# Altium footprint library Terra.PcbLib: 59 footprints (part 2 of 4)
Each footprint in its own frame and in the unit in brackets; x right, y up, seen from the top. Pads: shape width x height; smd on the part's side, far side on the other; paste and mask are expansions set on the pad; w line width, h text height; cw(c..) or ccw(c..) is an arc to the next point about the centre after c.
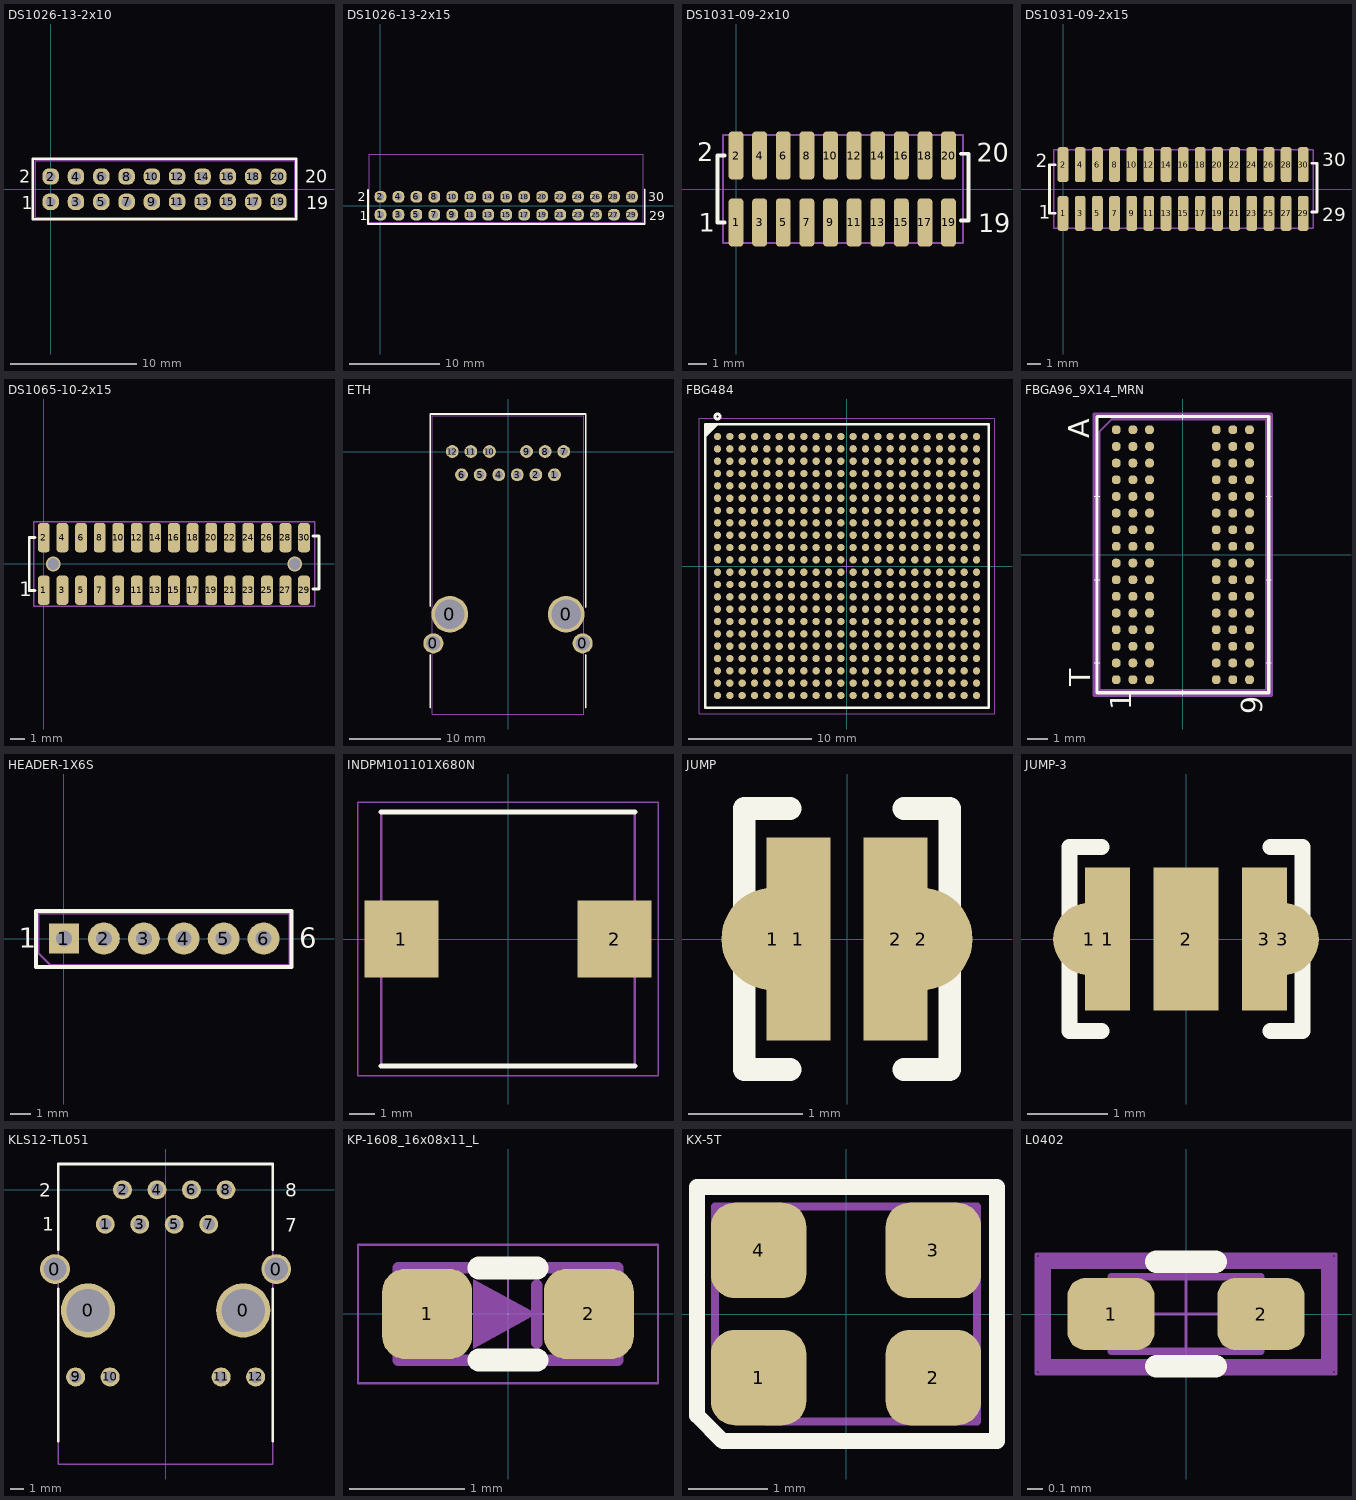
[diagram p1: the footprints below, top view; thin cyan lines are the x and y axes]

## DS1026-13-2x10 [mm]
pads (20):
  rrect80% 1.3x1.3 hole 0.8 mask+0.1: 1(0,-1) 2(0,1) 3(2,-1) 4(2,1) 5(4,-1) 6(4,1) 7(6,-1) 8(6,1) 9(8,-1) 10(8,1) 11(10,-1) 12(10,1) 13(12,-1) 14(12,1) 15(14,-1) 16(14,1) 17(16,-1) 18(16,1) 19(18,-1) 20(18,1)
Top Overlay:
  lines w0.2: -1.4,-2.375 19.4,-2.375 19.4,2.4 -1.4,2.4 -1.4,-2.375
  text "19" at 20.2,-1.6 h1
  text "1" at -2.3,-1.6 h1
  text "20" at 20.1,0.5 h1
  text "2" at -2.5,0.5 h1
  text ".Designator" at 5.6,-3.3 h1
Mechanical 1:
  lines w0.1: -1.226,-2.271 -1.225,2.255 19.276,2.25 19.274,-2.276 -1.226,-2.271
  text ".Designator" at 0.95,-0.4 h1.5
  text "1" at -0.1,-1.4 h1
  text "2" at -0.3,0.7 h1
  text "19" at 17.5,-1.5 h1
  text "20" at 17.6,0.6 h1
3D body: height 6.5, standoff -1.5, extent -1.27,-2.265 19.27,2.275

## DS1026-13-2x15 [mm]
pads (30):
  rrect80% 1.3x1.3 hole 0.8 mask+0.1: 1(0,-1) 2(0,1) 3(2,-1) 4(2,1) 5(4,-1) 6(4,1) 7(6,-1) 8(6,1) 9(8,-1) 10(8,1) 11(10,-1) 12(10,1) 13(12,-1) 14(12,1) 15(14,-1) 16(14,1) 17(16,-1) 18(16,1) 19(18,-1) 20(18,1) 21(20,-1) 22(20,1) 23(22,-1) 24(22,1) 25(24,-1) 26(24,1) 27(26,-1) 28(26,1) 29(28,-1) 30(28,1)
Top Overlay:
  lines w0.2: -1.375,1.75 -1.375,-2.025 29.425,-2.025 29.425,1.8
  text ".Designator" at 9.658,-3.468 h1
  text "2" at -2.5,0.5 h1
  text "30" at 29.8,0.5 h1
  text "1" at -2.3,-1.6 h1
  text "29" at 29.9,-1.6 h1
Mechanical 1:
  lines w0.1: -1.226,-1.846 29.274,-1.854 29.276,5.749 -1.224,5.757 -1.226,-1.846
  text "30" at 27.3,0.6 h1
  text "29" at 27.2,-1.5 h1
  text "2" at -0.3,0.7 h1
  text "1" at -0.1,-1.4 h1
  text ".Designator" at 8.5,1.2 h1.5
3D body "DS1026-13.STEP": height 5, standoff -1.9, extent -1.225,-1.375 29.275,5.725

## DS1031-09-2x10 [mm]
pads (20):
  rrect50% 0.8x2.6 smd mask+0.1: 1(0,-1.8) 2(0,1.8) 3(1.27,-1.8) 4(1.27,1.8) 5(2.54,-1.8) 6(2.54,1.8) 7(3.81,-1.8) 8(3.81,1.8) 9(5.08,-1.8) 10(5.08,1.8) 11(6.35,-1.8) 12(6.35,1.8) 13(7.62,-1.8) 14(7.62,1.8) 15(8.89,-1.8) 16(8.89,1.8) 17(10.16,-1.8) 18(10.16,1.8) 19(11.43,-1.8) 20(11.43,1.8)
Top Overlay:
  lines w0.2: -0.6,-1.8 -1,-1.8 -1,1.8 -0.6,1.8 ; 12.1,-1.7 12.5,-1.7 12.5,1.9 12.1,1.9
  text "1" at -2,-2.3 h1
  text "2" at -2.1,1.5 h1
  text "19" at 13.036,-2.328 h1
  text "20" at 12.936,1.472 h1
  text ".Designator" at 2.558,3.732 h1
Mechanical 1:
  lines w0.1: -0.701,-2.898 12.199,-2.901 12.201,2.897 -0.7,2.9 -0.701,-2.898
  text "1" at -2,-2.3 h1
  text "2" at -2.1,1.5 h1
  text "20" at 12.936,1.472 h1
  text "19" at 13.036,-2.328 h1
  text ".Designator" at 2.1,-0.7 h1.5
3D body "DS1031-09-2X10.STEP": height 5.96, standoff -0.04, extent -0.61,-2.85 12.09,2.85

## DS1031-09-2x15 [mm]
pads (30):
  rrect50% 0.8x2.6 smd mask+0.1: 1(0,-1.8) 2(0,1.8) 3(1.27,-1.8) 4(1.27,1.8) 5(2.54,-1.8) 6(2.54,1.8) 7(3.81,-1.8) 8(3.81,1.8) 9(5.08,-1.8) 10(5.08,1.8) 11(6.35,-1.8) 12(6.35,1.8) 13(7.62,-1.8) 14(7.62,1.8) 15(8.89,-1.8) 16(8.89,1.8) 17(10.16,-1.8) 18(10.16,1.8) 19(11.43,-1.8) 20(11.43,1.8) 21(12.7,-1.8) 22(12.7,1.8) 23(13.97,-1.8) 24(13.97,1.8) 25(15.24,-1.8) 26(15.24,1.8) 27(16.51,-1.8) 28(16.51,1.8) 29(17.78,-1.8) 30(17.78,1.8)
Top Overlay:
  lines w0.2: -0.6,-1.8 -1,-1.8 -1,1.8 -0.6,1.8 ; 18.4,-1.7 18.8,-1.7 18.8,1.9 18.4,1.9
  text ".Designator" at 3.958,3.532 h1
  text "1" at -1.8,-2.2 h1
  text "30" at 19.2,1.7 h1
  text "29" at 19.2,-2.4 h1
  text "2" at -2,1.6 h1
Mechanical 1:
  lines w0.1: -0.701,-2.898 18.499,-2.903 18.501,2.895 -0.7,2.9 -0.701,-2.898
  text ".Designator" at 3.8,-0.5 h1.5
  text "2" at -0.1,1.4 h1
  text "1" at 0,-1.8 h1
  text "30" at 16.3,1.4 h1
  text "29" at 16.1,-2.5 h1
3D body "DS1031-09-2X15X.STEP": height 5.97, standoff -0.03, extent -0.66,-2.881 18.39,2.819

## DS1065-10-2х15 [mm]
pads (30):
  rrect50% 0.8x2 smd mask+0.1: 1(0,-1.8) 2(0,1.8) 3(1.27,-1.8) 4(1.27,1.8) 5(2.54,-1.8) 6(2.54,1.8) 7(3.81,-1.8) 8(3.81,1.8) 9(5.08,-1.8) 10(5.08,1.8) 11(6.35,-1.8) 12(6.35,1.8) 13(7.62,-1.8) 14(7.62,1.8) 15(8.89,-1.8) 16(8.89,1.8) 17(10.16,-1.8) 18(10.16,1.8) 19(11.43,-1.8) 20(11.43,1.8) 21(12.7,-1.8) 22(12.7,1.8) 23(13.97,-1.8) 24(13.97,1.8) 25(15.24,-1.8) 26(15.24,1.8) 27(16.51,-1.8) 28(16.51,1.8) 29(17.78,-1.8) 30(17.78,1.8)
via 17.145,0 diameter 1 hole 0.8
via 0.635,0 diameter 1 hole 0.8
Top Overlay:
  lines w0.2: -0.6,-1.8 -1,-1.8 -1,1.8 -0.6,1.8 ; 18.4,-1.7 18.8,-1.7 18.8,1.9 18.4,1.9
  text ".Designator" at 4.858,3.532 h1
  text "1" at -1.7,-2.2 h1
Mechanical 1:
  lines w0.1: -0.701,-2.898 -0.7,2.9 18.501,2.895 18.499,-2.903 -0.701,-2.898
  text ".Designator" at 5.08,-0.508 h0.8
3D body "DS1065-05.STEP": height 4.45, standoff -0.9, extent -0.81,-2.35 18.56,2.35

## ETH [mm] "10/100 ETH разъём с двумя светодиодами"
height 14
pads (16):
  round 2.2 hole 1.6 mask+0.1: 0(-8.15,-20.96) 0(8.15,-20.96)
  round 4 hole 3.2 mask+0.1: 0(-6.35,-17.78) 0(6.35,-17.78)
  round 1.4 hole 0.9 mask+0.1: 1(5.075,-2.54) 2(3.045,-2.54) 3(1.015,-2.54) 4(-1.015,-2.54) 5(-3.045,-2.54) 6(-5.075,-2.54) 7(6.09,0) 8(4.06,0) 9(2.03,0) 10(-2.03,0) 11(-4.06,0) 12(-6.09,0)
Top Overlay:
  lines w0.2: -8.5,-28 -8.5,-22.2 ; -8.5,-16.9 -8.5,4.1 8.5,4.1 8.5,-17 ; 8.5,-28 8.5,-22.2
Mechanical 1:
  lines w0.1: -8.3,-28.68 -8.3,3.9 8.3,3.9 8.3,-28.68 -8.3,-28.68
  text "12" at -6.7,1.3 h1
  text "7" at 6.2,1.3 h1
  text "6" at -5.7,-4.7 h1
  text "1" at 4.9,-4.7 h1
  text ".Designator" at -5.4,-10.575 h2

## FBG484 [mm] "BGA, 484-Balls, Body 23x23mm, Pitch 1.0mm"
height 2.54
pads (484):
  round 0.6 smd: A1(-10.5,10.5) A2(-9.5,10.5) A3(-8.5,10.5) A4(-7.5,10.5) A5(-6.5,10.5) A6(-5.5,10.5) A7(-4.5,10.5) A8(-3.5,10.5) A9(-2.5,10.5) A10(-1.5,10.5) A11(-0.5,10.5) A12(0.5,10.5) A13(1.5,10.5) A14(2.5,10.5) A15(3.5,10.5) A16(4.5,10.5) A17(5.5,10.5) A18(6.5,10.5) A19(7.5,10.5) A20(8.5,10.5) A21(9.5,10.5) A22(10.5,10.5) AA1(-10.5,-9.5) AA2(-9.5,-9.5) AA3(-8.5,-9.5) AA4(-7.5,-9.5) AA5(-6.5,-9.5) AA6(-5.5,-9.5) AA7(-4.5,-9.5) AA8(-3.5,-9.5) AA9(-2.5,-9.5) AA10(-1.5,-9.5) AA11(-0.5,-9.5) AA12(0.5,-9.5) AA13(1.5,-9.5) AA14(2.5,-9.5) AA15(3.5,-9.5) AA16(4.5,-9.5) AA17(5.5,-9.5) AA18(6.5,-9.5) AA19(7.5,-9.5) AA20(8.5,-9.5) AA21(9.5,-9.5) AA22(10.5,-9.5) AB1(-10.5,-10.5) AB2(-9.5,-10.5) AB3(-8.5,-10.5) AB4(-7.5,-10.5) AB5(-6.5,-10.5) AB6(-5.5,-10.5) AB7(-4.5,-10.5) AB8(-3.5,-10.5) AB9(-2.5,-10.5) AB10(-1.5,-10.5) AB11(-0.5,-10.5) AB12(0.5,-10.5) AB13(1.5,-10.5) AB14(2.5,-10.5) AB15(3.5,-10.5) AB16(4.5,-10.5) AB17(5.5,-10.5) AB18(6.5,-10.5) AB19(7.5,-10.5) AB20(8.5,-10.5) AB21(9.5,-10.5) AB22(10.5,-10.5) B1(-10.5,9.5) B2(-9.5,9.5) B3(-8.5,9.5) B4(-7.5,9.5) B5(-6.5,9.5) B6(-5.5,9.5) B7(-4.5,9.5) B8(-3.5,9.5) B9(-2.5,9.5) B10(-1.5,9.5) B11(-0.5,9.5) B12(0.5,9.5) B13(1.5,9.5) B14(2.5,9.5) B15(3.5,9.5) B16(4.5,9.5) B17(5.5,9.5) B18(6.5,9.5) B19(7.5,9.5) B20(8.5,9.5) B21(9.5,9.5) B22(10.5,9.5) C1(-10.5,8.5) C2(-9.5,8.5) C3(-8.5,8.5) C4(-7.5,8.5) C5(-6.5,8.5) C6(-5.5,8.5) C7(-4.5,8.5) C8(-3.5,8.5) C9(-2.5,8.5) C10(-1.5,8.5) C11(-0.5,8.5) C12(0.5,8.5) C13(1.5,8.5) C14(2.5,8.5) C15(3.5,8.5) C16(4.5,8.5) C17(5.5,8.5) C18(6.5,8.5) C19(7.5,8.5) C20(8.5,8.5) C21(9.5,8.5) C22(10.5,8.5) D1(-10.5,7.5) D2(-9.5,7.5) D3(-8.5,7.5) D4(-7.5,7.5) D5(-6.5,7.5) D6(-5.5,7.5) D7(-4.5,7.5) D8(-3.5,7.5) D9(-2.5,7.5) D10(-1.5,7.5) D11(-0.5,7.5) D12(0.5,7.5) D13(1.5,7.5) D14(2.5,7.5) D15(3.5,7.5) D16(4.5,7.5) D17(5.5,7.5) D18(6.5,7.5) D19(7.5,7.5) D20(8.5,7.5) D21(9.5,7.5) D22(10.5,7.5) E1(-10.5,6.5) E2(-9.5,6.5) E3(-8.5,6.5) E4(-7.5,6.5) E5(-6.5,6.5) E6(-5.5,6.5) E7(-4.5,6.5) E8(-3.5,6.5) E9(-2.5,6.5) E10(-1.5,6.5) E11(-0.5,6.5) E12(0.5,6.5) E13(1.5,6.5) E14(2.5,6.5) E15(3.5,6.5) E16(4.5,6.5) E17(5.5,6.5) E18(6.5,6.5) E19(7.5,6.5) E20(8.5,6.5) E21(9.5,6.5) E22(10.5,6.5) F1(-10.5,5.5) F2(-9.5,5.5) F3(-8.5,5.5) F4(-7.5,5.5) F5(-6.5,5.5) F6(-5.5,5.5) F7(-4.5,5.5) F8(-3.5,5.5) F9(-2.5,5.5) F10(-1.5,5.5) F11(-0.5,5.5) F12(0.5,5.5) F13(1.5,5.5) F14(2.5,5.5) F15(3.5,5.5) F16(4.5,5.5) F17(5.5,5.5) F18(6.5,5.5) F19(7.5,5.5) F20(8.5,5.5) F21(9.5,5.5) F22(10.5,5.5) G1(-10.5,4.5) G2(-9.5,4.5) G3(-8.5,4.5) G4(-7.5,4.5) G5(-6.5,4.5) G6(-5.5,4.5) G7(-4.5,4.5) G8(-3.5,4.5) G9(-2.5,4.5) G10(-1.5,4.5) G11(-0.5,4.5) G12(0.5,4.5) G13(1.5,4.5) G14(2.5,4.5) G15(3.5,4.5) G16(4.5,4.5) G17(5.5,4.5) G18(6.5,4.5) G19(7.5,4.5) G20(8.5,4.5) G21(9.5,4.5) G22(10.5,4.5) H1(-10.5,3.5) H2(-9.5,3.5) H3(-8.5,3.5) H4(-7.5,3.5) H5(-6.5,3.5) H6(-5.5,3.5) H7(-4.5,3.5) H8(-3.5,3.5) H9(-2.5,3.5) H10(-1.5,3.5) H11(-0.5,3.5) H12(0.5,3.5) H13(1.5,3.5) H14(2.5,3.5) H15(3.5,3.5) H16(4.5,3.5) H17(5.5,3.5) H18(6.5,3.5) H19(7.5,3.5) H20(8.5,3.5) H21(9.5,3.5) H22(10.5,3.5) J1(-10.5,2.5) J2(-9.5,2.5) J3(-8.5,2.5) J4(-7.5,2.5) J5(-6.5,2.5) J6(-5.5,2.5) J7(-4.5,2.5) J8(-3.5,2.5) J9(-2.5,2.5) J10(-1.5,2.5) J11(-0.5,2.5) J12(0.5,2.5) J13(1.5,2.5) J14(2.5,2.5) J15(3.5,2.5) J16(4.5,2.5) J17(5.5,2.5) J18(6.5,2.5) J19(7.5,2.5) J20(8.5,2.5) J21(9.5,2.5) J22(10.5,2.5) K1(-10.5,1.5) K2(-9.5,1.5) K3(-8.5,1.5) K4(-7.5,1.5) K5(-6.5,1.5) K6(-5.5,1.5) K7(-4.5,1.5) K8(-3.5,1.5) K9(-2.5,1.5) K10(-1.5,1.5) K11(-0.5,1.5) K12(0.5,1.5) K13(1.5,1.5) K14(2.5,1.5) K15(3.5,1.5) K16(4.5,1.5) K17(5.5,1.5) K18(6.5,1.5) K19(7.5,1.5) K20(8.5,1.5) K21(9.5,1.5) K22(10.5,1.5) L1(-10.5,0.5) L2(-9.5,0.5) L3(-8.5,0.5) L4(-7.5,0.5) L5(-6.5,0.5) L6(-5.5,0.5) L7(-4.5,0.5) L8(-3.5,0.5) L9(-2.5,0.5) L10(-1.5,0.5) L11(-0.5,0.5) L12(0.5,0.5) L13(1.5,0.5) L14(2.5,0.5) L15(3.5,0.5) L16(4.5,0.5) L17(5.5,0.5) L18(6.5,0.5) L19(7.5,0.5) L20(8.5,0.5) L21(9.5,0.5) L22(10.5,0.5) M1(-10.5,-0.5) M2(-9.5,-0.5) M3(-8.5,-0.5) M4(-7.5,-0.5) M5(-6.5,-0.5) M6(-5.5,-0.5) M7(-4.5,-0.5) M8(-3.5,-0.5) M9(-2.5,-0.5) M10(-1.5,-0.5) M11(-0.5,-0.5) M12(0.5,-0.5) M13(1.5,-0.5) M14(2.5,-0.5) M15(3.5,-0.5) M16(4.5,-0.5) M17(5.5,-0.5) M18(6.5,-0.5) M19(7.5,-0.5) M20(8.5,-0.5) M21(9.5,-0.5) M22(10.5,-0.5) N1(-10.5,-1.5) N2(-9.5,-1.5) N3(-8.5,-1.5) N4(-7.5,-1.5) N5(-6.5,-1.5) N6(-5.5,-1.5) N7(-4.5,-1.5) N8(-3.5,-1.5) N9(-2.5,-1.5) N10(-1.5,-1.5) N11(-0.5,-1.5) N12(0.5,-1.5) N13(1.5,-1.5) N14(2.5,-1.5) N15(3.5,-1.5) N16(4.5,-1.5) N17(5.5,-1.5) N18(6.5,-1.5) N19(7.5,-1.5) N20(8.5,-1.5) N21(9.5,-1.5) N22(10.5,-1.5) P1(-10.5,-2.5) P2(-9.5,-2.5) P3(-8.5,-2.5) P4(-7.5,-2.5) P5(-6.5,-2.5) P6(-5.5,-2.5) P7(-4.5,-2.5) P8(-3.5,-2.5) P9(-2.5,-2.5) P10(-1.5,-2.5) P11(-0.5,-2.5) P12(0.5,-2.5) P13(1.5,-2.5) P14(2.5,-2.5) P15(3.5,-2.5) P16(4.5,-2.5) P17(5.5,-2.5) P18(6.5,-2.5) P19(7.5,-2.5) P20(8.5,-2.5) P21(9.5,-2.5) P22(10.5,-2.5) R1(-10.5,-3.5) R2(-9.5,-3.5) R3(-8.5,-3.5) R4(-7.5,-3.5) R5(-6.5,-3.5) R6(-5.5,-3.5) R7(-4.5,-3.5) R8(-3.5,-3.5) R9(-2.5,-3.5) R10(-1.5,-3.5) R11(-0.5,-3.5) R12(0.5,-3.5) R13(1.5,-3.5) R14(2.5,-3.5) R15(3.5,-3.5) R16(4.5,-3.5) R17(5.5,-3.5) R18(6.5,-3.5) R19(7.5,-3.5) R20(8.5,-3.5) R21(9.5,-3.5) R22(10.5,-3.5) T1(-10.5,-4.5) T2(-9.5,-4.5) T3(-8.5,-4.5) T4(-7.5,-4.5) T5(-6.5,-4.5) T6(-5.5,-4.5) T7(-4.5,-4.5) T8(-3.5,-4.5) T9(-2.5,-4.5) T10(-1.5,-4.5) T11(-0.5,-4.5) T12(0.5,-4.5) T13(1.5,-4.5) T14(2.5,-4.5) T15(3.5,-4.5) T16(4.5,-4.5) T17(5.5,-4.5) T18(6.5,-4.5) T19(7.5,-4.5) T20(8.5,-4.5) T21(9.5,-4.5) T22(10.5,-4.5) U1(-10.5,-5.5) U2(-9.5,-5.5) U3(-8.5,-5.5) U4(-7.5,-5.5) U5(-6.5,-5.5) U6(-5.5,-5.5) U7(-4.5,-5.5) U8(-3.5,-5.5) U9(-2.5,-5.5) U10(-1.5,-5.5) U11(-0.5,-5.5) U12(0.5,-5.5) U13(1.5,-5.5) U14(2.5,-5.5) U15(3.5,-5.5) U16(4.5,-5.5) U17(5.5,-5.5) U18(6.5,-5.5) U19(7.5,-5.5) U20(8.5,-5.5) U21(9.5,-5.5) U22(10.5,-5.5) V1(-10.5,-6.5) V2(-9.5,-6.5) V3(-8.5,-6.5) V4(-7.5,-6.5) V5(-6.5,-6.5) V6(-5.5,-6.5) V7(-4.5,-6.5) V8(-3.5,-6.5) V9(-2.5,-6.5) V10(-1.5,-6.5) V11(-0.5,-6.5) V12(0.5,-6.5) V13(1.5,-6.5) V14(2.5,-6.5) V15(3.5,-6.5) V16(4.5,-6.5) V17(5.5,-6.5) V18(6.5,-6.5) V19(7.5,-6.5) V20(8.5,-6.5) V21(9.5,-6.5) V22(10.5,-6.5) W1(-10.5,-7.5) W2(-9.5,-7.5) W3(-8.5,-7.5) W4(-7.5,-7.5) W5(-6.5,-7.5) W6(-5.5,-7.5) W7(-4.5,-7.5) W8(-3.5,-7.5) W9(-2.5,-7.5) W10(-1.5,-7.5) W11(-0.5,-7.5) W12(0.5,-7.5) W13(1.5,-7.5) W14(2.5,-7.5) W15(3.5,-7.5) W16(4.5,-7.5) W17(5.5,-7.5) W18(6.5,-7.5) W19(7.5,-7.5) W20(8.5,-7.5) W21(9.5,-7.5) W22(10.5,-7.5) Y1(-10.5,-8.5) Y2(-9.5,-8.5) Y3(-8.5,-8.5) Y4(-7.5,-8.5) Y5(-6.5,-8.5) Y6(-5.5,-8.5) Y7(-4.5,-8.5) Y8(-3.5,-8.5) Y9(-2.5,-8.5) Y10(-1.5,-8.5) Y11(-0.5,-8.5) Y12(0.5,-8.5) Y13(1.5,-8.5) Y14(2.5,-8.5) Y15(3.5,-8.5) Y16(4.5,-8.5) Y17(5.5,-8.5) Y18(6.5,-8.5) Y19(7.5,-8.5) Y20(8.5,-8.5) Y21(9.5,-8.5) Y22(10.5,-8.5)
Top Overlay:
  circle w0.25: c-10.5,12.125 r0.2
  region: -10.5,11.5 -11.5,10.5 -11.5,11.5
  lines w0.2: -11.5,10.5 -10.5,11.5 ; -11.5,-11.5 -11.5,11.5 11.5,11.5 11.5,-11.5 -11.5,-11.5
Mechanical 1:
  lines w0.1: -11.5,-11.5 11.5,-11.5 11.5,11.5 -10.6,11.5 -11.5,10.6 -11.5,-11.5
  text ".Designator" at -5.5,-0.5 h1.5
Mechanical 15:
  lines w0.05: -12,-12 -12,12 12,12 12,-12 -12,-12
  lines w0.1: -0.5,0 0.5,0 ; 0,-0.5 0,0.5
3D body: height 2.54, standoff 0.4, extent -11.5,-11.5 11.5,11.5

## FBGA96_9X14_MRN [mm]
pads (96):
  rrect80% 0.42x0.42 smd paste+0 mask+0: A1(-3.2,6) A2(-2.4,6) A3(-1.6,6) A7(1.6,6) A8(2.4,6) A9(3.2,6) B1(-3.2,5.2) B2(-2.4,5.2) B3(-1.6,5.2) B7(1.6,5.2) B8(2.4,5.2) B9(3.2,5.2) C1(-3.2,4.4) C2(-2.4,4.4) C3(-1.6,4.4) C7(1.6,4.4) C8(2.4,4.4) C9(3.2,4.4) D1(-3.2,3.6) D2(-2.4,3.6) D3(-1.6,3.6) D7(1.6,3.6) D8(2.4,3.6) D9(3.2,3.6) E1(-3.2,2.8) E2(-2.4,2.8) E3(-1.6,2.8) E7(1.6,2.8) E8(2.4,2.8) E9(3.2,2.8) F1(-3.2,2) F2(-2.4,2) F3(-1.6,2) F7(1.6,2) F8(2.4,2) F9(3.2,2) G1(-3.2,1.2) G2(-2.4,1.2) G3(-1.6,1.2) G7(1.6,1.2) G8(2.4,1.2) G9(3.2,1.2) H1(-3.2,0.4) H2(-2.4,0.4) H3(-1.6,0.4) H7(1.6,0.4) H8(2.4,0.4) H9(3.2,0.4) J1(-3.2,-0.4) J2(-2.4,-0.4) J3(-1.6,-0.4) J7(1.6,-0.4) J8(2.4,-0.4) J9(3.2,-0.4) K1(-3.2,-1.2) K2(-2.4,-1.2) K3(-1.6,-1.2) K7(1.6,-1.2) K8(2.4,-1.2) K9(3.2,-1.2) L1(-3.2,-2) L2(-2.4,-2) L3(-1.6,-2) L7(1.6,-2) L8(2.4,-2) L9(3.2,-2) M1(-3.2,-2.8) M2(-2.4,-2.8) M3(-1.6,-2.8) M7(1.6,-2.8) M8(2.4,-2.8) M9(3.2,-2.8) N1(-3.2,-3.6) N2(-2.4,-3.6) N3(-1.6,-3.6) N7(1.6,-3.6) N8(2.4,-3.6) N9(3.2,-3.6) P1(-3.2,-4.4) P2(-2.4,-4.4) P3(-1.6,-4.4) P7(1.6,-4.4) P8(2.4,-4.4) P9(3.2,-4.4) R1(-3.2,-5.2) R2(-2.4,-5.2) R3(-1.6,-5.2) R7(1.6,-5.2) R8(2.4,-5.2) R9(3.2,-5.2) T1(-3.2,-6) T2(-2.4,-6) T3(-1.6,-6) T7(1.6,-6) T8(2.4,-6) T9(3.2,-6)
Top Overlay:
  lines w0.025: -4.255,-5.2 -4,-5.2 ; -4.255,-1.2 -4,-1.2 ; -4.255,2.8 -4,2.8 ; 0,-6.756 0,-6.502 ; 0,6.502 0,6.756 ; 4,-5.2 4.255,-5.2 ; 4,-1.2 4.255,-1.2 ; 4,2.8 4.255,2.8
  lines w0.152: -4.127,-6.629 -4.127,6.629 4.127,6.629 4.127,-6.629 -4.127,-6.629
  text "9" at 3.8,-7.65 h1
  text "1" at -2.49,-7.463 h1
  text "A" at -4.5,5.6 h1
  text "T" at -4.45,-6.325 h1
Mechanical 1:
  lines w0.1: -4,-6.502 4,-6.502 4,6.502 -3.423,6.502 -4,5.924 -4,-6.502
  text ".Designator" at 0.6,-5.075 h1.5
  text "A" at -5.271,5.365 h1
  text "1" at -2.565,7.137 h1
  text "9" at 3.835,7.137 h1
  text "T" at -5.271,-6.635 h1
Mechanical 15:
  lines w0.152: -4.255,-6.756 4.255,-6.756 4.255,6.756 -4.255,6.756 -4.255,-6.756
3D body "FBGA96_9X14_MRN.step": height 0.99, standoff 0, extent -4,-6.502 4,6.502

## HEADER-1X6S [mm] "PLD2-10  Штыревой соединитель 1х5 шаг 2мм однорядный прямой"
height 6
pads (6):
  rect 1.501x1.501 hole 0.8 mask+0.1: 1(0,0)
  round 1.601 hole 0.8 mask+0.1: 2(2,0) 3(4,0) 4(6,0) 5(8,0) 6(10,0)
Top Overlay:
  lines w0.2: -1.4,-1.425 11.4,-1.425 11.4,1.378 -1.4,1.374 -1.4,-1.425
  text ".Designator" at 0.658,2.132 h1
  text "1" at -2.25,-0.45 h1
  text "6" at 11.775,-0.45 h1
Mechanical 1:
  lines w0.1: -1.275,-0.725 -0.675,-1.325 11.3,-1.325 11.3,1.25 -1.275,1.25 -1.275,-0.725
  text "1" at -0.4,-0.5 h1
  text "6" at 9.7,-0.5 h1
Mechanical 13:
  text ".Designator" at -0.625,-0.625 h1.5
3D body "CONN_6x1.STEP": height 6.5, standoff -1.5, extent -1.265,-1.295 11.275,1.245

## INDPM101101X680N [mm]
pads (2):
  rect 2.95x3.05 smd: 1(-4.25,0) 2(4.25,0)
Top Overlay:
  lines w0.2: -5.05,-5.05 5.05,-5.05 ; -5.05,5.05 5.05,5.05
Mechanical 13:
  lines w0.1: -5.05,-5.05 5.05,-5.05 5.05,5.05 -5.05,5.05 -5.05,-5.05
Mechanical 15:
  lines w0.05: -5.975,-5.45 5.975,-5.45 5.975,5.45 -5.975,5.45 -5.975,-5.45
3D body "SLF10165T-100M3R8-3PF.stp": height 6.8, standoff 0, extent -5.05,-5.05 5.05,5.05

## JUMP [mm]
height 1.1
pads (4):
  round 0.9 smd paste+0: 1(-0.65,0) 2(0.65,0)
  rect 0.559x1.778 smd mask+0.1: 1(-0.425,0) 2(0.425,0)
Top Overlay:
  lines w0.2: -0.5,-1.143 -0.9,-1.143 -0.9,1.143 -0.5,1.143 ; 0.5,-1.143 0.9,-1.143 0.9,1.143 0.5,1.143
Mechanical 1:
  lines w0.1: -0.653,-1.143 -0.9,-1.143 -0.9,1.143 -0.653,1.143 ; 0.653,-1.143 0.9,-1.143 0.9,1.143 0.653,1.143
  text ".Designator" at 0.3,-1.1 h0.8

## JUMP-3 [mm]
pads (5):
  round 0.9 smd paste+0: 1(-1.2,0) 3(1.2,0)
  rect 0.559x1.778 smd mask+0.1: 1(-0.975,0) 3(0.975,0)
  rect 0.813x1.778 smd mask+0.1: 2(0,0)
Top Overlay:
  lines w0.2: -1.05,-1.143 -1.45,-1.143 -1.45,1.143 -1.05,1.143 ; 1.05,-1.143 1.45,-1.143 1.45,1.143 1.05,1.143
Mechanical 1:
  lines w0.1: -1.203,-1.143 -1.45,-1.143 -1.45,1.143 -1.203,1.143 ; 1.203,-1.143 1.45,-1.143 1.45,1.143 1.203,1.143
  text ".Designator" at 0.275,-1.65 h0.8

## KLS12-TL051 [mm] "10/100 ETH разъём с двумя светодиодами"
height 14
pads (16):
  round 2.2 hole 1.7 mask+0.1: 0(-8.15,-5.84) 0(8.15,-5.84)
  round 4 hole 3.2 mask+0.1: 0(-5.715,-8.89) 0(5.715,-8.89)
  round 1.4 hole 0.9 mask+0.1: 1(-4.445,-2.54) 2(-3.175,0) 3(-1.905,-2.54) 4(-0.635,0) 5(0.635,-2.54) 6(1.905,0) 7(3.175,-2.54) 8(4.445,0) 9(-6.63,-13.79) 10(-4.09,-13.79) 11(4.09,-13.79) 12(6.63,-13.79)
Top Overlay:
  lines w0.2: -7.9,-18.5 -7.9,-7.3 ; -7.9,-4.4 -7.9,1.9 7.9,1.9 7.9,-4.4 ; 7.9,-18.5 7.9,-7.3
  text ".Designator" at -4.1,3.1 h1
  text "2" at -9.3,-0.5 h1
  text "1" at -9.1,-3 h1
  text "7" at 8.8,-3.1 h1
  text "8" at 8.8,-0.5 h1
Mechanical 1:
  lines w0.1: -7.9,-20.2 -7.9,1.9 7.9,1.9 7.9,-20.2 -7.9,-20.2
  text "8" at 5.715,-0.635 h1
  text "7" at 5.08,-3.175 h1
  text "2" at -5.715,-0.635 h1
  text "1" at -6.35,-3.175 h1
  text ".Designator" at -7.5,-7.8 h3
3D body "User Library-KLS12-TL076.STEP": height 15.8, standoff -3.5, extent -9.875,-20.2 9.875,1.7

## KP-1608_16x08x11_L [mm] "SODFL, 2-Leads, Body 0,80x1,20mm, IPC High Density"
height 1.1
pads (2):
  rrect50% 0.78x0.78 smd: 1(-0.7,0) 2(0.7,0)
Top Overlay:
  lines w0.2: -0.25,-0.4 0.25,-0.4 ; -0.25,0.4 0.25,0.4
Mechanical 1:
  lines w0.1: 0.25,-0.25 0.25,0.25 ; -0.95,-0.4 0.95,-0.4 0.95,0.4 -0.95,0.4 -0.95,-0.4
  text ".Designator" at -0.9,-0.25 h0.5
Mechanical 13:
  region: -0.3,-0.3 0.25,0 -0.3,0.3
Mechanical 15:
  lines w0.02: -0.3,0 0.3,0 ; 0,-0.325 0,0.325 ; -1.3,-0.6 1.3,-0.6 1.3,0.6 -1.3,0.6 -1.3,-0.6
3D body "KP-1608_16x08x11.STEP": height 1.1, standoff 0, extent -0.8,-0.4 0.8,0.4

## KX-5T [mm]
pads (4):
  rrect50% 1.2x1.2 smd mask+0.102: 1(-1.1,-0.8) 2(1.1,-0.8) 3(1.1,0.8) 4(-1.1,0.8)
Top Overlay:
  lines w0.2: -1.875,-1.275 -1.55,-1.6 1.9,-1.6 1.9,1.6 -1.875,1.6 -1.875,-1.275
Mechanical 1:
  lines w0.1: -1.65,-0.7 -1.65,1.35 1.65,1.35 1.65,-1.35 -1,-1.35 -1.65,-0.7
  text ".Designator" at -1.375,-0.275 h0.8
3D body "SMD-3225_4P.STEP": height 1.05, standoff 0, extent -1.6,-1.2 1.6,1.3

## L0402 [mm] "Chip Choke 1.0x0.5mm"
height 0.4
pads (2):
  rrect50% 0.58x0.48 smd: 1(-0.5,0) 2(0.5,0)
Top Overlay:
  lines w0.15: -0.2,-0.35 0.2,-0.35 ; -0.2,0.35 0.2,0.35
Mechanical 1:
  lines w0.1: -0.95,-0.35 -0.95,0.35 0.95,0.35 0.95,-0.35 -0.95,-0.35
  text ".Designator" at -0.75,-0.2 h0.4
Mechanical 13:
  lines w0.05: -0.5,-0.25 0.5,-0.25 0.5,0.25 -0.5,0.25 -0.5,-0.25
Mechanical 15:
  lines w0.02: -0.3,0 0.3,0 ; 0,-0.3 0,0.3 ; -1,-0.4 1,-0.4 1,0.4 -1,0.4 -1,-0.4
3D body: height 1.3, standoff 0, extent -0.55,-0.3 0.55,0.3